# Altium footprint library MyPcbLib.PcbLib: 222 footprints (part 4 of 14)
Each footprint in its own frame and in the unit in brackets; x right, y up, seen from the top. Pads: shape width x height; smd on the part's side, far side on the other; paste and mask are expansions set on the pad; w line width, h text height; cw(c..) or ccw(c..) is an arc to the next point about the centre after c.
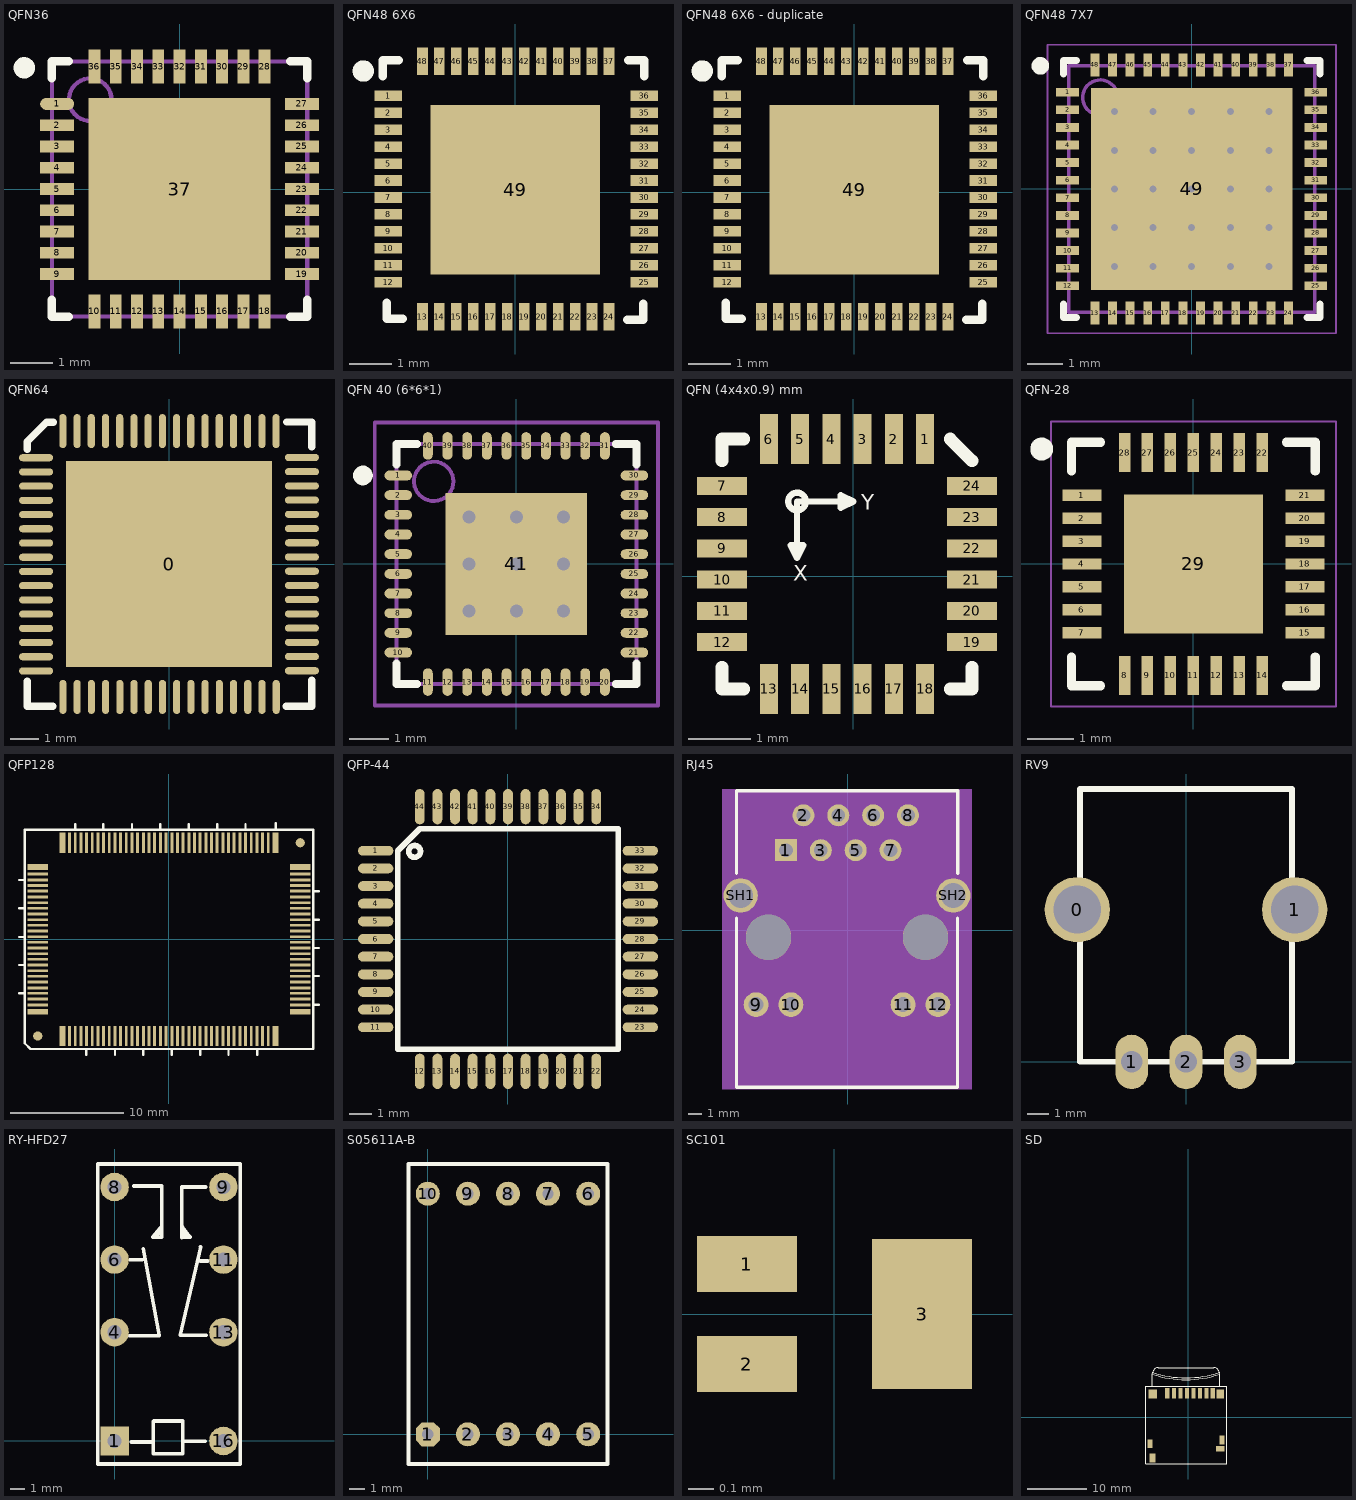
[diagram p3: the footprints below, top view; thin cyan lines are the x and y axes]

## QFN36 [mm] "PQFN, 36-Leads, Body 6.00x6.00mm, Pitch 0.50mm, Thermal Pad 4.28x4.28mm, IPC Medium Density"
height 1
pads (37):
  oval 0.8x0.28 smd: 1(-2.879,2)
  rect 0.8x0.28 smd: 2(-2.879,1.5) 3(-2.879,1) 4(-2.879,0.5) 5(-2.879,0) 6(-2.879,-0.5) 7(-2.879,-1) 8(-2.879,-1.5) 9(-2.879,-2) 19(2.879,-2) 20(2.879,-1.5) 21(2.879,-1) 22(2.879,-0.5) 23(2.879,0) 24(2.879,0.5) 25(2.879,1) 26(2.879,1.5) 27(2.879,2)
  rect 0.28x0.8 smd: 10(-2,-2.879) 11(-1.5,-2.879) 12(-1,-2.879) 13(-0.5,-2.879) 14(0,-2.879) 15(0.5,-2.879) 16(1,-2.879) 17(1.5,-2.879) 18(2,-2.879) 28(2,2.879) 29(1.5,2.879) 30(1,2.879) 31(0.5,2.879) 32(0,2.879) 33(-0.5,2.879) 34(-1,2.879) 35(-1.5,2.879) 36(-2,2.879)
  rect 4.28x4.28 smd: 37(0,0)
Top Overlay:
  circle w0.25: c-3.65,2.85 r0.125
  lines w0.2: -3,-2.6 -3,-3 -2.6,-3 ; -3,2.6 -3,3 -2.6,3 ; 2.6,-3 3,-3 3,-2.6 ; 2.6,3 3,3 3,2.6
Mechanical 13:
  circle w0.1: c-2.1,2.1 r0.5
  lines w0.1: -3,-3 3,-3 3,3 -3,3 -3,-3
3D body "QFN36 6x6.STEP": height 0.9, standoff 0.01, extent -3.102,-3.102 3.103,3.103

## QFN48 6X6 [mm] "QFN, 48-Leads, Body 7.00x7.00mm, Pitch 0.50mm, Thermal Pad 5.73x5.73mm, IPC Medium Density"
height 1
pads (49):
  rect 0.65x0.25 smd: 1(-2.997,2.271) 2(-2.997,1.871) 3(-2.997,1.471) 4(-2.997,1.071) 5(-2.997,0.671) 6(-2.997,0.271) 7(-2.997,-0.129) 8(-2.997,-0.529) 9(-2.997,-0.929) 10(-2.997,-1.329) 11(-2.997,-1.729) 12(-2.997,-2.129) 25(3.048,-2.129) 26(3.048,-1.729) 27(3.048,-1.329) 28(3.048,-0.929) 29(3.048,-0.529) 30(3.048,-0.129) 31(3.048,0.271) 32(3.048,0.671) 33(3.048,1.071) 34(3.048,1.471) 35(3.048,1.871) 36(3.048,2.271)
  rect 0.25x0.65 smd: 13(-2.184,-2.941) 14(-1.784,-2.941) 15(-1.384,-2.941) 16(-0.984,-2.941) 17(-0.584,-2.941) 18(-0.184,-2.941) 19(0.216,-2.941) 20(0.616,-2.941) 21(1.016,-2.941) 22(1.416,-2.941) 23(1.816,-2.941) 24(2.216,-2.941) 37(2.216,3.083) 38(1.816,3.083) 39(1.416,3.083) 40(1.016,3.083) 41(0.616,3.083) 42(0.216,3.083) 43(-0.184,3.083) 44(-0.584,3.083) 45(-0.984,3.083) 46(-1.384,3.083) 47(-1.784,3.083) 48(-2.184,3.083)
  rect 4x4 smd: 49(0,0.055)
Top Overlay:
  circle w0.25: c-3.581,2.855 r0.125
  lines w0.2: -3.118,2.734 -3.118,3.109 -2.743,3.109 ; -3.023,-2.612 -3.023,-2.987 -2.648,-2.987 ; 2.648,-3.013 3.023,-3.013 3.023,-2.638 ; 2.673,3.109 3.048,3.109 3.048,2.734
3D body "QFN48.step": height 0.85, standoff -0.02, extent -2.992,-2.931 3.048,3.109

## QFN48 6X6 - duplicate [mm] "QFN, 48-Leads, Body 7.00x7.00mm, Pitch 0.50mm, Thermal Pad 5.73x5.73mm, IPC Medium Density"
height 1
pads (49):
  rect 0.65x0.25 smd: 1(-2.997,2.271) 2(-2.997,1.871) 3(-2.997,1.471) 4(-2.997,1.071) 5(-2.997,0.671) 6(-2.997,0.271) 7(-2.997,-0.129) 8(-2.997,-0.529) 9(-2.997,-0.929) 10(-2.997,-1.329) 11(-2.997,-1.729) 12(-2.997,-2.129) 25(3.048,-2.129) 26(3.048,-1.729) 27(3.048,-1.329) 28(3.048,-0.929) 29(3.048,-0.529) 30(3.048,-0.129) 31(3.048,0.271) 32(3.048,0.671) 33(3.048,1.071) 34(3.048,1.471) 35(3.048,1.871) 36(3.048,2.271)
  rect 0.25x0.65 smd: 13(-2.184,-2.941) 14(-1.784,-2.941) 15(-1.384,-2.941) 16(-0.984,-2.941) 17(-0.584,-2.941) 18(-0.184,-2.941) 19(0.216,-2.941) 20(0.616,-2.941) 21(1.016,-2.941) 22(1.416,-2.941) 23(1.816,-2.941) 24(2.216,-2.941) 37(2.216,3.083) 38(1.816,3.083) 39(1.416,3.083) 40(1.016,3.083) 41(0.616,3.083) 42(0.216,3.083) 43(-0.184,3.083) 44(-0.584,3.083) 45(-0.984,3.083) 46(-1.384,3.083) 47(-1.784,3.083) 48(-2.184,3.083)
  rect 4x4 smd: 49(0,0.055)
Top Overlay:
  circle w0.25: c-3.581,2.855 r0.125
  lines w0.2: -3.118,2.734 -3.118,3.109 -2.743,3.109 ; -3.023,-2.612 -3.023,-2.987 -2.648,-2.987 ; 2.648,-3.013 3.023,-3.013 3.023,-2.638 ; 2.673,3.109 3.048,3.109 3.048,2.734
3D body "QFN48.step": height 0.85, standoff -0.02, extent -2.992,-2.931 3.048,3.109

## QFN48 7X7 [mm] "QFN, 48-Leads, Body 7.00x7.00mm, Pitch 0.50mm, Thermal Pad 5.73x5.73mm, IPC Medium Density"
height 1
pads (49):
  rect 0.65x0.25 smd: 1(-3.525,2.75) 2(-3.525,2.25) 3(-3.525,1.75) 4(-3.525,1.25) 5(-3.525,0.75) 6(-3.525,0.25) 7(-3.525,-0.25) 8(-3.525,-0.75) 9(-3.525,-1.25) 10(-3.525,-1.75) 11(-3.525,-2.25) 12(-3.525,-2.75) 25(3.525,-2.75) 26(3.525,-2.25) 27(3.525,-1.75) 28(3.525,-1.25) 29(3.525,-0.75) 30(3.525,-0.25) 31(3.525,0.25) 32(3.525,0.75) 33(3.525,1.25) 34(3.525,1.75) 35(3.525,2.25) 36(3.525,2.75)
  rect 0.25x0.65 smd: 13(-2.75,-3.525) 14(-2.25,-3.525) 15(-1.75,-3.525) 16(-1.25,-3.525) 17(-0.75,-3.525) 18(-0.25,-3.525) 19(0.25,-3.525) 20(0.75,-3.525) 21(1.25,-3.525) 22(1.75,-3.525) 23(2.25,-3.525) 24(2.75,-3.525) 37(2.75,3.525) 38(2.25,3.525) 39(1.75,3.525) 40(1.25,3.525) 41(0.75,3.525) 42(0.25,3.525) 43(-0.25,3.525) 44(-0.75,3.525) 45(-1.25,3.525) 46(-1.75,3.525) 47(-2.25,3.525) 48(-2.75,3.525)
  rect 5.73x5.73 smd: 49(0,0)
via -2.2,2.2 diameter 0.5 hole 0.2
via -1.1,2.2 diameter 0.5 hole 0.2
via 0,2.2 diameter 0.5 hole 0.2
via 1.1,2.2 diameter 0.5 hole 0.2
via 2.2,2.2 diameter 0.5 hole 0.2
via -2.2,1.1 diameter 0.5 hole 0.2
via -1.1,1.1 diameter 0.5 hole 0.2
via 0,1.1 diameter 0.5 hole 0.2
via 1.1,1.1 diameter 0.5 hole 0.2
via 2.2,1.1 diameter 0.5 hole 0.2
via -2.2,0 diameter 0.5 hole 0.2
via -1.1,0 diameter 0.5 hole 0.2
via 0,0 diameter 0.5 hole 0.2
via 1.1,0 diameter 0.5 hole 0.2
via 2.2,0 diameter 0.5 hole 0.2
via -2.2,-1.1 diameter 0.5 hole 0.2
via -1.1,-1.1 diameter 0.5 hole 0.2
via 0,-1.1 diameter 0.5 hole 0.2
via 1.1,-1.1 diameter 0.5 hole 0.2
via 2.2,-1.1 diameter 0.5 hole 0.2
via -2.2,-2.2 diameter 0.5 hole 0.2
via -1.1,-2.2 diameter 0.5 hole 0.2
via 0,-2.2 diameter 0.5 hole 0.2
via 1.1,-2.2 diameter 0.5 hole 0.2
via 2.2,-2.2 diameter 0.5 hole 0.2
Top Overlay:
  circle w0.25: c-4.3,3.5 r0.125
  lines w0.2: -3.65,-3.275 -3.65,-3.65 -3.275,-3.65 ; -3.65,3.275 -3.65,3.65 -3.275,3.65 ; 3.275,-3.65 3.65,-3.65 3.65,-3.275 ; 3.275,3.65 3.65,3.65 3.65,3.275
Mechanical 13:
  circle w0.1: c-2.6,2.6 r0.5
  lines w0.1: -3.5,-3.5 -3.5,3.5 3.5,3.5 3.5,-3.5 -3.5,-3.5
Mechanical 15:
  lines w0.05: -4.1,-4.1 -4.1,4.1 4.1,4.1 4.1,-4.1 -4.1,-4.1
  lines w0.1: -0.5,0 0.5,0 ; 0,-0.5 0,0.5
3D body: height 1, standoff 0.08, extent -3.5,-3.556 3.5,3.444

## QFN64 [mm]
pads (65):
  rect 7.25x7.25 smd: 0(0,-0.001)
  oval 1.2x0.25 smd: 1(-4.674,3.738) 2(-4.674,3.238) 3(-4.674,2.738) 4(-4.674,2.238) 5(-4.674,1.738) 6(-4.674,1.238) 7(-4.674,0.738) 8(-4.674,0.238) 9(-4.674,-0.262) 10(-4.674,-0.762) 11(-4.674,-1.262) 12(-4.674,-1.762) 13(-4.674,-2.262) 14(-4.674,-2.762) 15(-4.674,-3.262) 16(-4.674,-3.762) 33(4.674,-3.754) 34(4.674,-3.254) 35(4.674,-2.754) 36(4.674,-2.254) 37(4.674,-1.754) 38(4.674,-1.254) 39(4.674,-0.754) 40(4.674,-0.254) 41(4.674,0.246) 42(4.674,0.746) 43(4.674,1.246) 44(4.674,1.746) 45(4.674,2.246) 46(4.674,2.746) 47(4.674,3.246) 48(4.674,3.746)
  oval 0.25x1.2 smd: 17(-3.73,-4.675) 18(-3.23,-4.675) 19(-2.73,-4.675) 20(-2.23,-4.675) 21(-1.73,-4.675) 22(-1.23,-4.675) 23(-0.73,-4.675) 24(-0.23,-4.675) 25(0.27,-4.675) 26(0.77,-4.675) 27(1.27,-4.675) 28(1.77,-4.675) 29(2.27,-4.675) 30(2.77,-4.675) 31(3.27,-4.675) 32(3.77,-4.675) 49(3.767,4.675) 50(3.267,4.675) 51(2.767,4.675) 52(2.267,4.675) 53(1.767,4.675) 54(1.267,4.675) 55(0.767,4.675) 56(0.267,4.675) 57(-0.233,4.675) 58(-0.733,4.675) 59(-1.233,4.675) 60(-1.733,4.675) 61(-2.233,4.675) 62(-2.733,4.675) 63(-3.233,4.675) 64(-3.733,4.675)
Top Overlay:
  lines w0.254: -4.983,-4.116 -4.983,-5.004 -4.089,-5.004 ; -4.983,4.032 -4.983,4.312 -4.31,4.985 -4.064,4.985 ; 4.115,-5.004 5.017,-5.004 5.017,-4.091 ; 4.14,4.995 5.017,4.996 5.017,4.113
3D body "User Library-QFN64-2.step": height 0.9, standoff 0, extent -4.52,-4.521 4.52,4.519

## QFN 40 (6*6*1) [mm] "QFN, 40-Leads, Body 6.1x6.1mm (max), Pitch 0.50mm, IPC Medium Density"
height 1
pads (41):
  oval 0.7x0.25 smd: 1(-3,2.25) 2(-3,1.75) 3(-3,1.25) 4(-3,0.75) 5(-3,0.25) 6(-3,-0.25) 7(-3,-0.75) 8(-3,-1.25) 9(-3,-1.75) 10(-3,-2.25) 21(3,-2.25) 22(3,-1.75) 23(3,-1.25) 24(3,-0.75) 25(3,-0.25) 26(3,0.25) 27(3,0.75) 28(3,1.25) 29(3,1.75) 30(3,2.25)
  oval 0.25x0.7 smd: 11(-2.25,-3) 12(-1.75,-3) 13(-1.25,-3) 14(-0.75,-3) 15(-0.25,-3) 16(0.25,-3) 17(0.75,-3) 18(1.25,-3) 19(1.75,-3) 20(2.25,-3) 31(2.25,3) 32(1.75,3) 33(1.25,3) 34(0.75,3) 35(0.25,3) 36(-0.25,3) 37(-0.75,3) 38(-1.25,3) 39(-1.75,3) 40(-2.25,3)
  rect 3.6x3.6 smd: 41(0,0)
via -1.2,1.2 diameter 0.66 hole 0.33
via 0,1.2 diameter 0.66 hole 0.33
via 1.2,1.2 diameter 0.66 hole 0.33
via -1.2,0 diameter 0.66 hole 0.33
via 0,0 diameter 0.66 hole 0.33
via 1.2,0 diameter 0.66 hole 0.33
via -1.2,-1.2 diameter 0.66 hole 0.33
via 0,-1.2 diameter 0.66 hole 0.33
via 1.2,-1.2 diameter 0.66 hole 0.33
Top Overlay:
  circle w0.25: c-3.9,2.25 r0.125
  lines w0.2: -3.05,-2.525 -3.05,-3.05 -2.525,-3.05 ; -3.05,2.525 -3.05,3.05 -2.525,3.05 ; 2.525,-3.05 3.05,-3.05 3.05,-2.525 ; 2.525,3.05 3.05,3.05 3.05,2.525
Mechanical 13:
  circle w0.1: c-2.1,2.1 r0.5
  lines w0.1: -3.05,-3.05 -3.05,3.05 3.05,3.05 3.05,-3.05 -3.05,-3.05
Mechanical 15:
  lines w0.1: -0.5,0 0.5,0 ; 0,-0.5 0,0.5 ; -3.6,-3.6 -3.6,3.6 3.6,3.6 3.6,-3.6 -3.6,-3.6
3D body "User Library-QFN40 (6x6).step": height 0.9, standoff 0, extent -3,-2.997 3,3.003

## QFN (4x4x0.9) mm [mm] "QFN PACKAGE [MPU6000]"
pads (24):
  rect 0.29x0.8 smd: 1(1.146,2.195) 2(0.646,2.195) 3(0.146,2.195) 4(-0.354,2.195) 5(-0.854,2.195) 6(-1.354,2.195) 13(-1.354,-1.805) 14(-0.854,-1.805) 15(-0.354,-1.805) 16(0.146,-1.805) 17(0.646,-1.805) 18(1.146,-1.805)
  rect 0.8x0.29 smd: 7(-2.104,1.445) 8(-2.104,0.945) 9(-2.104,0.445) 10(-2.104,-0.055) 11(-2.104,-0.555) 12(-2.104,-1.055) 19(1.896,-1.055) 20(1.896,-0.555) 21(1.896,-0.055) 22(1.896,0.445) 23(1.896,0.945) 24(1.896,1.445)
Top Overlay:
  circle w0.1: c-0.904,1.195 r0.141
  lines w0.1: -0.904,0.295 -0.804,0.495 -1.004,0.495 -0.904,0.295 ; -0.904,0.295 -0.904,1.195 -0.004,1.195 ; -0.004,1.195 -0.204,1.095 -0.204,1.295 -0.004,1.195
  lines w0.203: -2.104,-1.455 -2.104,-1.805 -1.754,-1.805 ; -2.104,1.845 -2.104,2.195 -1.754,2.195 ; 1.546,-1.805 1.896,-1.805 1.896,-1.455 ; 1.546,2.195 1.896,1.845
  text "X" at -0.965,-0.076 h0.25
  text "Y" at 0.127,1.067 h0.25
3D body "User Library-QFN 24 4x4.STEP": height 0.9, standoff 0, extent -2.09,-1.85 1.914,2.154

## QFN-28 [mm] "QFN, 28-Leads, Body 5.00x5.00mm, Pitch 0.50mm, Thermal Pad 3.03x3.03mm, IPC Medium Density"
height 0.9
pads (29):
  rect 0.85x0.25 smd: 1(-2.425,1.5) 2(-2.425,1) 3(-2.425,0.5) 4(-2.425,0) 5(-2.425,-0.5) 6(-2.425,-1) 7(-2.425,-1.5) 15(2.425,-1.5) 16(2.425,-1) 17(2.425,-0.5) 18(2.425,0) 19(2.425,0.5) 20(2.425,1) 21(2.425,1.5)
  rect 0.25x0.85 smd: 8(-1.5,-2.425) 9(-1,-2.425) 10(-0.5,-2.425) 11(0,-2.425) 12(0.5,-2.425) 13(1,-2.425) 14(1.5,-2.425) 22(1.5,2.425) 23(1,2.425) 24(0.5,2.425) 25(0,2.425) 26(-0.5,2.425) 27(-1,2.425) 28(-1.5,2.425)
  rect 3.03x3.03 smd: 29(0,0)
Top Overlay:
  circle w0.25: c-3.3,2.5 r0.125
  lines w0.2: -2.65,-2.025 -2.65,-2.65 -2.025,-2.65 ; -2.65,2.025 -2.65,2.65 -2.025,2.65 ; 2.025,-2.65 2.65,-2.65 2.65,-2.025 ; 2.025,2.65 2.65,2.65 2.65,2.025
Mechanical 15:
  lines w0.05: -3.1,-3.1 -3.1,3.1 3.1,3.1 3.1,-3.1 -3.1,-3.1
  lines w0.1: -0.5,0 0.5,0 ; 0,-0.5 0,0.5
3D body "User Library-QFN28.STEP": height 0.9, standoff 0, extent -2.5,-2.525 2.54,2.515

## QFP128 [mil]
pads (130):
  rect 20x70 smd: 1(-369,-335) 38(369,-335) 65(369,335) 102(-369,335)
  rect 10x70 smd: 2(-345,-335) 3(-325,-335) 4(-305,-335) 5(-286,-335) 6(-266,-335) 7(-246,-335) 8(-227,-335) 9(-207,-335) 10(-187,-335) 11(-168,-335) 12(-148,-335) 13(-128,-335) 14(-109,-335) 15(-89,-335) 16(-69,-335) 17(-50,-335) 18(-30,-335) 19(-10,-335) 20(10,-335) 21(29,-335) 22(49,-335) 23(69,-335) 24(88,-335) 25(108,-335) 26(128,-335) 27(147,-335) 28(167,-335) 29(187,-335) 30(206,-335) 31(226,-335) 32(246,-335) 33(265,-335) 34(285,-335) 35(305,-335) 36(324,-335) 37(344,-335) 66(344,335) 67(324,335) 68(305,335) 69(285,335) 70(265,335) 71(246,335) 72(226,335) 73(206,335) 74(187,335) 75(167,335) 76(147,335) 77(128,335) 78(108,335) 79(88,335) 80(69,335) 81(49,335) 82(29,335) 83(10,335) 84(-10,335) 85(-30,335) 86(-50,335) 87(-69,335) 88(-89,335) 89(-109,335) 90(-128,335) 91(-148,335) 92(-168,335) 93(-187,335) 94(-207,335) 95(-227,335) 96(-246,335) 97(-266,335) 98(-286,335) 99(-305,335) 100(-325,335) 101(-345,335)
  rect 70x20 smd: 39(455,-251) 64(455,251) 103(-455,251) 128(-455,-251)
  rect 70x10 smd: 40(455,-227) 41(455,-207) 42(455,-187) 43(455,-168) 44(455,-148) 45(455,-128) 46(455,-109) 47(455,-89) 48(455,-69) 49(455,-50) 50(455,-30) 51(455,-10) 52(455,9) 53(455,29) 54(455,49) 55(455,68) 56(455,88) 57(455,108) 58(455,127) 59(455,147) 60(455,167) 61(455,187) 62(455,206) 63(455,226) 104(-455,226) 105(-455,206) 106(-455,187) 107(-455,167) 108(-455,147) 109(-455,127) 110(-455,108) 111(-455,88) 112(-455,68) 113(-455,49) 114(-455,29) 115(-455,9) 116(-455,-10) 117(-455,-30) 118(-455,-50) 119(-455,-69) 120(-455,-89) 121(-455,-109) 122(-455,-128) 123(-455,-148) 124(-455,-168) 125(-455,-187) 126(-455,-207) 127(-455,-227)
  round 32 smd: 129(-455,-335) 130(455,335)
Top Overlay:
  lines w8: -520,-187 -500,-187 ; -520,-89 -500,-89 ; -520,8 -500,8 ; -520,108 -500,108 ; -520,205.5 -500,205.5 ; -325,380 -325,400 ; -287,-400 -287,-380 ; -227.5,380 -227.5,400 ; -187,-400 -187,-380 ; -128,380 -128,400 ; -89.5,-400 -89.5,-380 ; -30,380 -30,400 ; 10,-400 10,-380 ; 69,380 69,400 ; 108,-400 108,-380 ; 167.5,380 167.5,400 ; 206,-400 206,-380 ; 265,380 265,400 ; 305.5,-400 305.5,-380 ; 370,382.5 370,402.5 ; 500,-227 520,-227 ; 500,-127 520,-127 ; 500,-30 520,-30 ; 500,68 520,68 ; 500,167 520,167 ; -500,-360 -500,380 500,380 500,-380 -480,-380 -500,-360
3D body "User Library-QFP5-128.step": height 114.17, standoff 0, extent -457.39,-339.17 456,338

## QFP-44 [mm]
pads (44):
  oval 1.6x0.45 smd: 1(-6,4) 2(-6,3.2) 3(-6,2.4) 4(-6,1.6) 5(-6,0.8) 6(-6,0) 7(-6,-0.8) 8(-6,-1.6) 9(-6,-2.4) 10(-6,-3.2) 11(-6,-4) 23(6,-4) 24(6,-3.2) 25(6,-2.4) 26(6,-1.6) 27(6,-0.8) 28(6,0) 29(6,0.8) 30(6,1.6) 31(6,2.4) 32(6,3.2) 33(6,4)
  oval 0.45x1.6 smd: 12(-4,-6) 13(-3.2,-6) 14(-2.4,-6) 15(-1.6,-6) 16(-0.8,-6) 17(0,-6) 18(0.8,-6) 19(1.6,-6) 20(2.4,-6) 21(3.2,-6) 22(4,-6) 34(4,6) 35(3.2,6) 36(2.4,6) 37(1.6,6) 38(0.8,6) 39(0,6) 40(-0.8,6) 41(-1.6,6) 42(-2.4,6) 43(-3.2,6) 44(-4,6)
Top Overlay:
  circle w0.254: c-4.232,3.972 r0.267
  lines w0.254: -5,-5 5,-5 5,5 -4,5 -5,4 -5,-5
3D body "User Library-44 pin tqfp ic package.STEP": height 1.1, standoff -0.01, extent -5.975,-5.975 6.025,6.025
3D body: height 1.15, standoff 0, extent -4.484,3.489 -3.488,4.487

## RJ45 [mm]
pads (16):
  rect 1.6x1.6 hole 1: 1(-4.496,5.84)
  round 1.6 hole 1: 2(-3.226,8.38) 3(-1.956,5.84) 4(-0.686,8.38) 5(0.584,5.84) 6(1.854,8.38) 7(3.124,5.84) 8(4.394,8.38)
  round 1.8 hole 1.1: 9(-6.676,-5.41) 10(-4.136,-5.41) 11(4.034,-5.41) 12(6.574,-5.41)
  round 2.5 hole 1.8: SH1(-7.796,2.54) SH2(7.694,2.54)
  round 3.3 hole 3.3 unplated: ""(-5.766,-0.51) ""(5.664,-0.51)
Top Overlay:
  lines w0.254: -8.101,0.87 -8.101,-11.43 7.999,-11.43 7.999,0.87 ; -8.101,4.17 -8.101,10.17 7.999,10.17 8,4.17
Mechanical 4:
  circle w1.65: c5.664,-0.51 r0.825
  circle w1.65: c-5.766,-0.51 r0.825
  region: -9.144,10.297 9.042,10.297 9.042,-11.557 -9.144,-11.557
Mechanical 5:
  circle w0.127: c5.664,-0.51 r1.65
  circle w0.127: c-5.766,-0.51 r1.65
  region: 6.444,3.79 8.944,3.79 8.944,1.29 6.444,1.29
  region: -9.046,3.79 -6.546,3.79 -6.546,1.29 -9.046,1.29
  region: 5.674,-4.51 7.474,-4.51 7.474,-6.31 5.674,-6.31
  region: 3.134,-4.51 4.934,-4.51 4.934,-6.31 3.134,-6.31
  region: -5.036,-4.51 -3.236,-4.51 -3.236,-6.31 -5.036,-6.31
  region: -7.576,-4.51 -5.776,-4.51 -5.776,-6.31 -7.576,-6.31
  region: 3.594,9.18 5.194,9.18 5.194,7.58 3.594,7.58
  region: 2.324,6.64 3.924,6.64 3.924,5.04 2.324,5.04
  region: 1.054,9.18 2.654,9.18 2.654,7.58 1.054,7.58
  region: -0.216,6.64 1.384,6.64 1.384,5.04 -0.216,5.04
  region: -1.486,9.18 0.114,9.18 0.114,7.58 -1.486,7.58
  region: -2.756,6.64 -1.156,6.64 -1.156,5.04 -2.756,5.04
  region: -4.026,9.18 -2.426,9.18 -2.426,7.58 -4.026,7.58
  region: -5.296,6.64 -3.696,6.64 -3.696,5.04 -5.296,5.04
Mechanical 15:
  lines w0.003: -0.076,0.215 -0.025,0.265

## RV9 [mm]
pads (5):
  round 3 hole 2.2: 0(-5,7) 1(5,7)
  oval 1.5x2.5 hole 1: 1(-2.5,0) 2(0,0) 3(2.5,0)
Top Overlay:
  lines w0.254: -4.876,0 -4.876,12.55 4.876,12.55 4.876,0 -4.876,0
3D body "User Library-RV09ACF-40_RK09K1130A5R.step": height 20, standoff -3.8, extent -4.876,0 4.876,12.55

## RY-HFD27 [mm]
pads (8):
  rect 2x2 hole 1: 1(0,0)
  round 2 hole 1: 4(0,7.62) 6(0,12.7) 8(0,17.78) 9(7.62,17.78) 11(7.62,12.7) 13(7.62,7.62) 16(7.62,0)
Top Overlay:
  lines w0.254: 1.022,7.375 3.128,7.375 2.004,13.46 ; 1.058,12.693 1.932,12.693 ; 1.183,-0.066 2.629,-0.066 ; 1.344,17.85 3.307,17.85 3.306,14.263 2.664,14.263 3.217,14.923 3.021,14.406 ; 4.734,15.013 5.287,14.281 5.269,14.263 4.698,14.245 4.699,17.779 6.394,17.779 ; 4.805,14.781 4.966,14.352 ; 4.877,-0.013 6.34,-0.013 ; 6.001,12.604 6.519,12.604 ; 6.019,13.585 4.609,7.411 6.429,7.411 ; -1.19,-1.61 8.81,-1.61 8.81,19.39 -1.19,19.39 -1.19,-1.61 ; 2.7,-0.887 2.7,1.076 2.7,1.361 2.736,1.397 4.77,1.397 4.77,-0.869 4.752,-0.887 2.7,-0.887
3D body "User Library-OMRON G5V-2.STEP": height 10.92, standoff -4, extent -1.143,-1.27 8.857,19.13

## S05611A-B [mil]
pads (10):
  oct 60x60 hole 28: 1(0,0)
  round 60 hole 28: 2(100,0) 3(200,0) 4(300,0) 5(400,0) 6(400,600) 7(300,600) 8(200,600) 9(100,600) 10(0,600)
Top Overlay:
  lines w10: -48.03,-74.02 448.03,-74.02 448.03,674.02 -48.03,674.02 -48.03,-74.02
  text ".56'" at 100,280 h60
3D body "S5611A-B.STEP": height 316.25, standoff -156.19, extent -50,-75 450,675

## SC101 [mm]
height 0.5
pads (3):
  rect 0.4x0.225 smd: 1(-0.35,0.2) 2(-0.35,-0.2)
  rect 0.4x0.6 smd: 3(0.35,0)
3D body "SC101.STEP": height 0.5, standoff 0, extent -0.519,-0.32 0.521,0.32

## SD [mm]
pads (14):
  rect 0.7x1.75 smd: P$1(-3.509,4.048) P$2(-2.409,4.048) P$3(-1.309,4.048) P$4(-0.209,4.048) P$5(0.891,4.048) P$6(1.991,4.048) P$7(3.091,4.048) P$8(4.151,4.048)
  rect 1.5x1.5 smd: P$9(-5.959,3.948)
  rect 1.3x1.5 smd: P$10(5.391,3.948)
  rect 0.8x1.5 smd: P$11(5.691,-3.802)
  rect 1.45x1 smd: P$12(5.391,-5.302)
  rect 0.8x1.4 smd: P$13(-6.409,-4.452)
  rect 1x1.55 smd: P$14(-6.009,-6.852)
Top Overlay:
  lines w0.127: -6.009,5.207 -6.009,7.248 -6.009,7.348 cw(c-5.009,7.348) -5.009,8.348 4.291,8.348 cw(c4.291,7.348) 5.291,7.348 5.291,7.248 ; -6.009,7.248 ccw(c-0.359,24.348) 5.291,7.248 ; -6.009,7.548 ccw(c-0.359,24.648) 5.291,7.548 ; 5.291,5.207 5.291,7.248 ; -7.112,-7.874 -7.112,5.207 6.477,5.207 6.477,-7.874 -7.112,-7.874
3D body "MicroSD.STEP": height 1.85, standoff -0.05, extent -7.515,-7.86 6.735,7.34